# Altium footprint library VESC_MotorController.PcbLib: 146 footprints (part 7 of 10)
Each footprint in its own frame and in the unit in brackets; x right, y up, seen from the top. Pads: shape width x height; smd on the part's side, far side on the other; paste and mask are expansions set on the pad; w line width, h text height; cw(c..) or ccw(c..) is an arc to the next point about the centre after c.
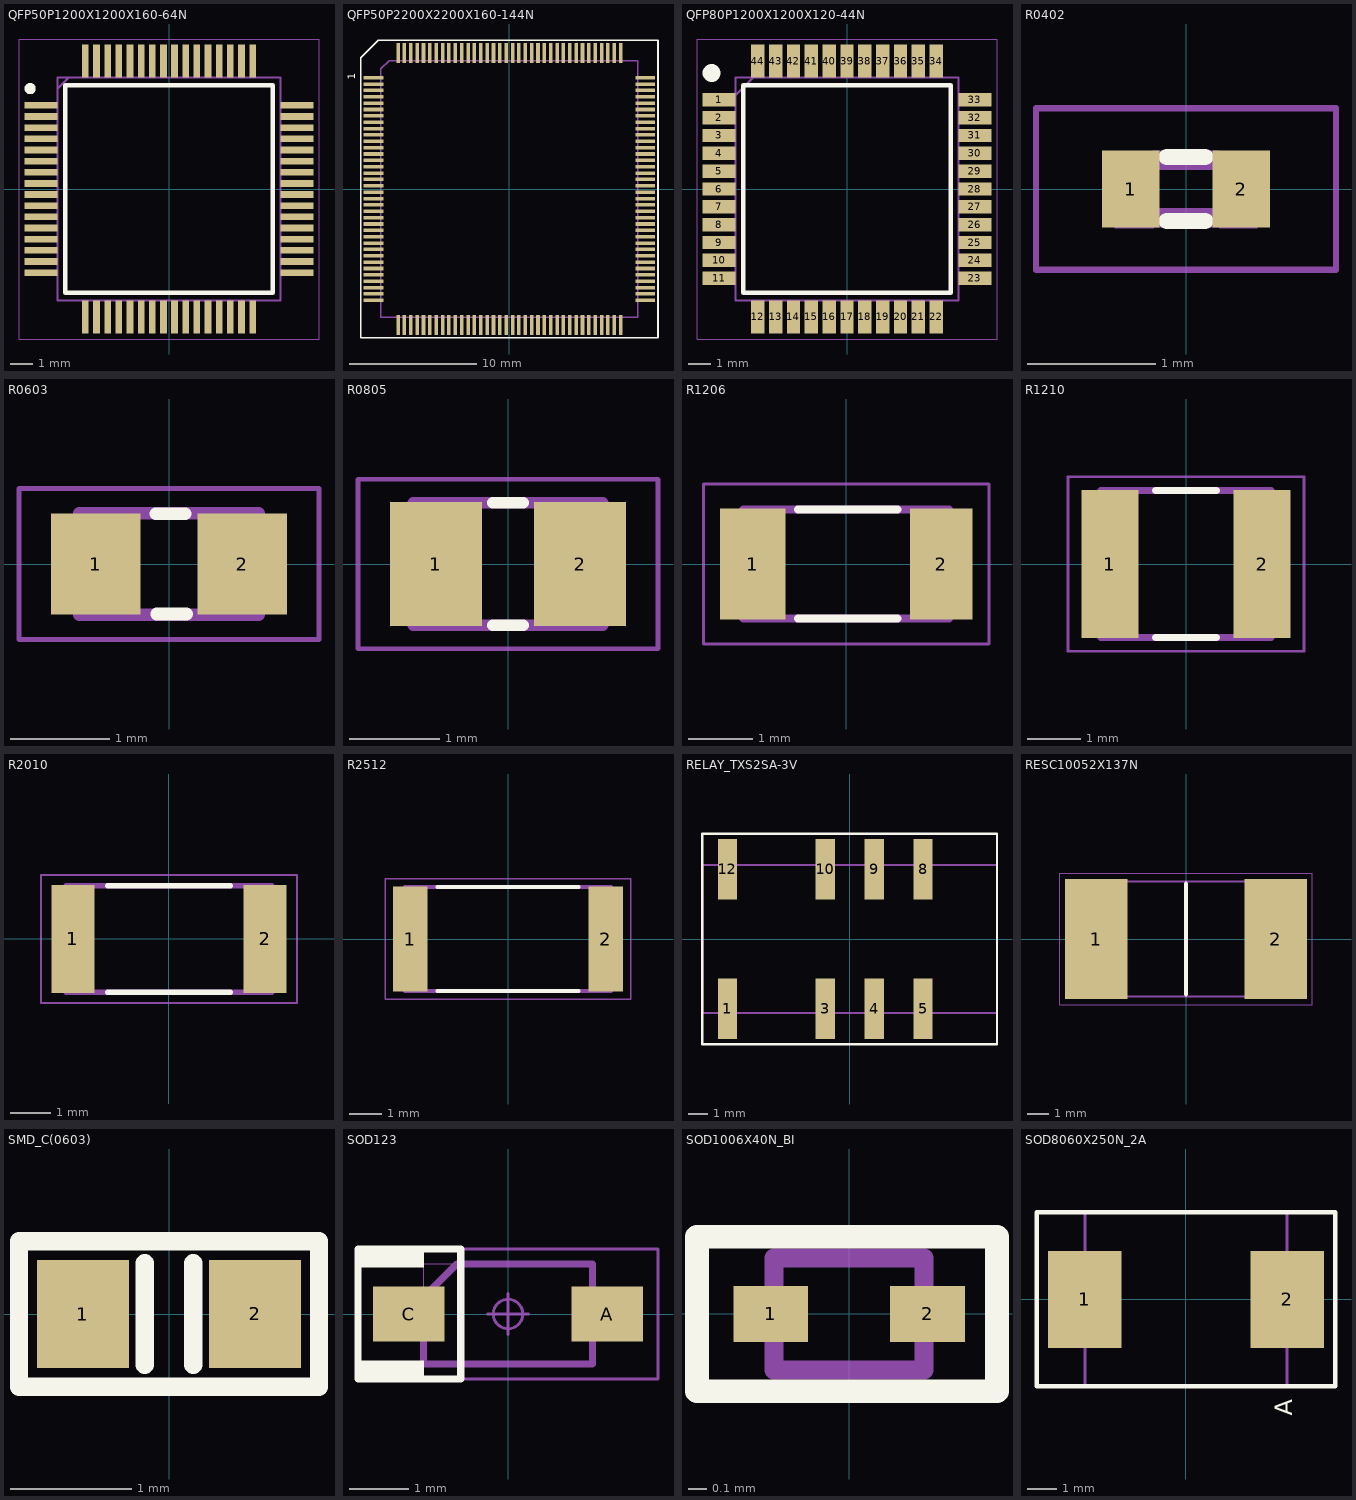
[diagram p6: the footprints below, top view; thin cyan lines are the x and y axes]

## QFP50P1200X1200X160-64N [mm]
pads (64):
  rect 1.475x0.3 smd: 1(-5.738,3.75) 2(-5.738,3.25) 3(-5.738,2.75) 4(-5.738,2.25) 5(-5.738,1.75) 6(-5.738,1.25) 7(-5.738,0.75) 8(-5.738,0.25) 9(-5.738,-0.25) 10(-5.738,-0.75) 11(-5.738,-1.25) 12(-5.738,-1.75) 13(-5.738,-2.25) 14(-5.738,-2.75) 15(-5.738,-3.25) 16(-5.738,-3.75) 33(5.738,-3.75) 34(5.738,-3.25) 35(5.738,-2.75) 36(5.738,-2.25) 37(5.738,-1.75) 38(5.738,-1.25) 39(5.738,-0.75) 40(5.738,-0.25) 41(5.738,0.25) 42(5.738,0.75) 43(5.738,1.25) 44(5.738,1.75) 45(5.738,2.25) 46(5.738,2.75) 47(5.738,3.25) 48(5.738,3.75)
  rect 0.3x1.475 smd: 17(-3.75,-5.738) 18(-3.25,-5.738) 19(-2.75,-5.738) 20(-2.25,-5.738) 21(-1.75,-5.738) 22(-1.25,-5.738) 23(-0.75,-5.738) 24(-0.25,-5.738) 25(0.25,-5.738) 26(0.75,-5.738) 27(1.25,-5.738) 28(1.75,-5.738) 29(2.25,-5.738) 30(2.75,-5.738) 31(3.25,-5.738) 32(3.75,-5.738) 49(3.75,5.738) 50(3.25,5.738) 51(2.75,5.738) 52(2.25,5.738) 53(1.75,5.738) 54(1.25,5.738) 55(0.75,5.738) 56(0.25,5.738) 57(-0.25,5.738) 58(-0.75,5.738) 59(-1.25,5.738) 60(-1.75,5.738) 61(-2.25,5.738) 62(-2.75,5.738) 63(-3.25,5.738) 64(-3.75,5.738)
Top Overlay:
  circle w0.25: c-6.225,4.5 r0.125
  lines w0.2: -4.65,-4.65 -4.65,4.65 4.65,4.65 4.65,-4.65 -4.65,-4.65
Mechanical 15:
  lines w0.1: -5,4.5 -4.5,5 ; -5,-5 -5,5 5,5 5,-5 -5,-5
Mechanical 20:
  lines w0.05: -6.725,-6.725 -6.725,6.725 6.725,6.725 6.725,-6.725 -6.725,-6.725
3D body "STM32F405RGT6TR.stp": height 1.6, standoff 0, extent -6,-6 6,6

## QFP50P2200X2200X160-144N [mm]
height 15
pads (144):
  rect 1.56x0.279 smd mask+0.051: 1(-10.68,8.75) 2(-10.68,8.25) 3(-10.68,7.75) 4(-10.68,7.25) 5(-10.68,6.75) 6(-10.68,6.25) 7(-10.68,5.75) 8(-10.68,5.25) 9(-10.68,4.75) 10(-10.68,4.25) 11(-10.68,3.75) 12(-10.68,3.25) 13(-10.68,2.75) 14(-10.68,2.25) 15(-10.68,1.75) 16(-10.68,1.25) 17(-10.68,0.75) 18(-10.68,0.25) 19(-10.68,-0.25) 20(-10.68,-0.75) 21(-10.68,-1.25) 22(-10.68,-1.75) 23(-10.68,-2.25) 24(-10.68,-2.75) 25(-10.68,-3.25) 26(-10.68,-3.75) 27(-10.68,-4.25) 28(-10.68,-4.75) 29(-10.68,-5.25) 30(-10.68,-5.75) 31(-10.68,-6.25) 32(-10.68,-6.75) 33(-10.68,-7.25) 34(-10.68,-7.75) 35(-10.68,-8.25) 36(-10.68,-8.75) 73(10.68,-8.75) 74(10.68,-8.25) 75(10.68,-7.75) 76(10.68,-7.25) 77(10.68,-6.75) 78(10.68,-6.25) 79(10.68,-5.75) 80(10.68,-5.25) 81(10.68,-4.75) 82(10.68,-4.25) 83(10.68,-3.75) 84(10.68,-3.25) 85(10.68,-2.75) 86(10.68,-2.25) 87(10.68,-1.75) 88(10.68,-1.25) 89(10.68,-0.75) 90(10.68,-0.25) 91(10.68,0.25) 92(10.68,0.75) 93(10.68,1.25) 94(10.68,1.75) 95(10.68,2.25) 96(10.68,2.75) 97(10.68,3.25) 98(10.68,3.75) 99(10.68,4.25) 100(10.68,4.75) 101(10.68,5.25) 102(10.68,5.75) 103(10.68,6.25) 104(10.68,6.75) 105(10.68,7.25) 106(10.68,7.75) 107(10.68,8.25) 108(10.68,8.75)
  rect 0.279x1.56 smd mask+0.051: 37(-8.75,-10.68) 38(-8.25,-10.68) 39(-7.75,-10.68) 40(-7.25,-10.68) 41(-6.75,-10.68) 42(-6.25,-10.68) 43(-5.75,-10.68) 44(-5.25,-10.68) 45(-4.75,-10.68) 46(-4.25,-10.68) 47(-3.75,-10.68) 48(-3.25,-10.68) 49(-2.75,-10.68) 50(-2.25,-10.68) 51(-1.75,-10.68) 52(-1.25,-10.68) 53(-0.75,-10.68) 54(-0.25,-10.68) 55(0.25,-10.68) 56(0.75,-10.68) 57(1.25,-10.68) 58(1.75,-10.68) 59(2.25,-10.68) 60(2.75,-10.68) 61(3.25,-10.68) 62(3.75,-10.68) 63(4.25,-10.68) 64(4.75,-10.68) 65(5.25,-10.68) 66(5.75,-10.68) 67(6.25,-10.68) 68(6.75,-10.68) 69(7.25,-10.68) 70(7.75,-10.68) 71(8.25,-10.68) 72(8.75,-10.68) 109(8.75,10.68) 110(8.25,10.68) 111(7.75,10.68) 112(7.25,10.68) 113(6.75,10.68) 114(6.25,10.68) 115(5.75,10.68) 116(5.25,10.68) 117(4.75,10.68) 118(4.25,10.68) 119(3.75,10.68) 120(3.25,10.68) 121(2.75,10.68) 122(2.25,10.68) 123(1.75,10.68) 124(1.25,10.68) 125(0.75,10.68) 126(0.25,10.68) 127(-0.25,10.68) 128(-0.75,10.68) 129(-1.25,10.68) 130(-1.75,10.68) 131(-2.25,10.68) 132(-2.75,10.68) 133(-3.25,10.68) 134(-3.75,10.68) 135(-4.25,10.68) 136(-4.75,10.68) 137(-5.25,10.68) 138(-5.75,10.68) 139(-6.25,10.68) 140(-6.75,10.68) 141(-7.25,10.68) 142(-7.75,10.68) 143(-8.25,10.68) 144(-8.75,10.68)
Top Overlay:
  lines w0.127: -11.684,-11.684 -11.684,10.316 -10.316,11.684 11.684,11.684 11.684,-11.684 -11.684,-11.684
  text "1" at -11.9,8.605 h1.02
Mechanical 13:
  lines w0.102: -10.1,-10.1 -10.1,9.458 -9.458,10.1 10.1,10.1 10.1,-10.1 -10.1,-10.1
  text "109" at 9.072,8.443 h1.02
  text "73" at 9.747,-9.361 h1.02
  text "37" at -8.402,-9.9 h1.02
  text "1" at -9.227,8.613 h1.02
  text ".Designator" at 0.688,-0.795 h1.02
3D body "STM32H753ZIT6.STEP": height 1.53, standoff -0.07, extent -11,-11 11,11

## QFP80P1200X1200X120-44N [mm]
pads (44):
  rect 1.475x0.6 smd: 1(-5.738,4) 2(-5.738,3.2) 3(-5.738,2.4) 4(-5.738,1.6) 5(-5.738,0.8) 6(-5.738,0) 7(-5.738,-0.8) 8(-5.738,-1.6) 9(-5.738,-2.4) 10(-5.738,-3.2) 11(-5.738,-4) 23(5.738,-4) 24(5.738,-3.2) 25(5.738,-2.4) 26(5.738,-1.6) 27(5.738,-0.8) 28(5.738,0) 29(5.738,0.8) 30(5.738,1.6) 31(5.738,2.4) 32(5.738,3.2) 33(5.738,4)
  rect 0.6x1.475 smd: 12(-4,-5.738) 13(-3.2,-5.738) 14(-2.4,-5.738) 15(-1.6,-5.738) 16(-0.8,-5.738) 17(0,-5.738) 18(0.8,-5.738) 19(1.6,-5.738) 20(2.4,-5.738) 21(3.2,-5.738) 22(4,-5.738) 34(4,5.738) 35(3.2,5.738) 36(2.4,5.738) 37(1.6,5.738) 38(0.8,5.738) 39(0,5.738) 40(-0.8,5.738) 41(-1.6,5.738) 42(-2.4,5.738) 43(-3.2,5.738) 44(-4,5.738)
Top Overlay:
  circle w0.4: c-6.075,5.2 r0.2
  lines w0.2: -4.65,-4.65 4.65,-4.65 4.65,4.65 -4.65,4.65 -4.65,-4.65
Mechanical 15:
  lines w0.1: -5,4.2 -4.2,5 ; -5,-5 5,-5 5,5 -5,5 -5,-5
Mechanical 20:
  lines w0.05: -6.725,-6.725 6.725,-6.725 6.725,6.725 -6.725,6.725 -6.725,-6.725
3D body "PIC16F74-I_PT.stp": height 1.2, standoff 0, extent -6,-6 6,6

## R0402 [mm]
pads (2):
  rect 0.45x0.6 smd: 1(-0.432,0) 2(0.432,0)
Top Overlay:
  lines w0.127: -0.15,-0.25 0.15,-0.25 ; -0.15,0.25 0.15,0.25
Mechanical 13:
  region: 0.559,-0.305 0.259,-0.305 0.259,0.295 0.559,0.295
  region: -0.254,-0.306 -0.555,-0.306 -0.555,0.295 -0.254,0.295
  lines w0.152: -0.245,-0.224 0.245,-0.224 ; -0.245,0.224 0.245,0.224
Mechanical 15:
  lines w0.051: -1.173,-0.633 -1.173,0.633 1.173,0.633 1.173,-0.633 -1.173,-0.633
3D body "RC0402FR-7D100RL.STP": height 0.41, standoff 0, extent -0.502,-0.246 0.498,0.254

## R0603 [mm] "RESISTOR SMD 0603"
height 0.45
pads (2):
  rect 0.9x1.02 smd: 1(-0.735,0) 2(0.735,0)
Top Overlay:
  lines w0.127: -0.135,0.506 0.165,0.506 ; -0.124,-0.502 0.176,-0.502
Mechanical 13:
  lines w0.127: -0.9,-0.51 0.9,-0.51 0.9,0.51 -0.9,0.51 -0.9,-0.51
Mechanical 15:
  lines w0.05: -1.508,-0.761 1.508,-0.761 1.508,0.761 -1.508,0.761 -1.508,-0.761
3D body "RC0603FR-072K2L.STP": height 0.56, standoff 0, extent -0.8,-0.4 0.8,0.4

## R0805 [mm]
pads (2):
  rect 1.02x1.38 smd: 1(-0.8,0) 2(0.8,0)
Top Overlay:
  lines w0.127: -0.17,-0.68 0.17,-0.68 ; -0.17,0.68 0.17,0.68
Mechanical 13:
  lines w0.127: -1.05,-0.68 1.05,-0.68 1.05,0.68 -1.05,0.68 -1.05,-0.68
Mechanical 15:
  lines w0.05: -1.665,-0.94 1.665,-0.94 1.665,0.94 -1.665,0.94 -1.665,-0.94
3D body "RC0805FR-0720RL.STP": height 0.61, standoff 0, extent -1,-0.625 1,0.625

## R1206 [mm]
height 1.1
pads (2):
  rect 1.02x1.73 smd: 1(-1.455,0)
  rect 0.97x1.73 smd: 2(1.48,0)
Top Overlay:
  lines w0.127: -0.75,-0.85 0.8,-0.85 ; -0.75,0.85 0.8,0.85
Mechanical 13:
  lines w0.127: -1.6,-0.85 1.6,-0.85 1.6,0.85 -1.6,0.85 -1.6,-0.85
Mechanical 15:
  lines w0.05: -2.22,-1.244 2.22,-1.244 2.22,1.244 -2.22,1.244 -2.22,-1.244
3D body "RC1206FR-0720RL.STP": height 0.66, standoff 0, extent -1.55,-0.8 1.55,0.8

## R1210 [mm]
pads (2):
  rect 1.07x2.77 smd: 1(-1.43,0) 2(1.43,0)
Top Overlay:
  lines w0.127: -0.57,-1.38 0.57,-1.38 ; -0.57,1.38 0.57,1.38
Mechanical 13:
  lines w0.127: -1.6,-1.38 -1.6,1.38 1.6,1.38 1.6,-1.38 -1.6,-1.38
Mechanical 15:
  lines w0.05: -2.215,-1.635 -2.215,1.635 2.215,1.635 2.215,-1.635 -2.215,-1.635
3D body "RC1210FR-0720RL.STP": height 0.66, standoff 0, extent -1.55,-1.3 1.55,1.3

## R2010 [mm]
pads (2):
  rect 1.07x2.67 smd: 1(-2.38,0) 2(2.38,0)
Top Overlay:
  lines w0.127: -1.52,-1.32 1.52,-1.32 ; -1.52,1.32 1.52,1.32
Mechanical 13:
  lines w0.127: -2.55,-1.32 2.55,-1.32 2.55,1.32 -2.55,1.32 -2.55,-1.32
Mechanical 15:
  lines w0.05: -3.165,-1.585 3.165,-1.585 3.165,1.585 -3.165,1.585 -3.165,-1.585
3D body "RC2010FK-0739KL.STP": height 0.66, standoff 0, extent -2.5,-1.25 2.5,1.25

## R2512 [mm]
pads (2):
  rect 1.07x3.27 smd: 1(-3.055,0) 2(3.055,0)
Top Overlay:
  lines w0.127: -2.2,-1.63 2.2,-1.63 ; -2.2,1.63 2.2,1.63
Mechanical 13:
  lines w0.127: -3.22,-1.63 3.22,-1.63 3.22,1.63 -3.22,1.63 -3.22,-1.63
Mechanical 15:
  lines w0.05: -3.84,-1.885 3.84,-1.885 3.84,1.885 -3.84,1.885 -3.84,-1.885
3D body "RC2512FK-0720RL.STP": height 0.66, standoff 0, extent -3.175,-1.55 3.175,1.55

## RELAY_TXS2SA-3V [mm]
pads (8):
  rect 1x3.16 smd paste+0 mask+0.051: 1(-6.35,-3.62) 3(-1.27,-3.62) 4(1.27,-3.62) 5(3.81,-3.62) 8(3.81,3.62) 9(1.27,3.62) 10(-1.27,3.62) 12(-6.35,3.62)
Top Overlay:
  lines w0.127: -7.65,-5.461 -7.65,5.461 7.65,5.461 7.65,-5.461 -7.65,-5.461
Mechanical 13:
  lines w0.102: -7.65,-3.85 -7.65,3.85 7.65,3.85 7.65,-3.85 -7.65,-3.85
  text ".Designator" at 1.088,0.215 h1.02
3D body "Relay_Panasonic_TXS2SA-3V_eec.STEP": height 8.7, standoff 0, extent -7.5,-4.7 7.5,4.7

## RESC10052X137N [mm]
pads (2):
  rect 2.85x5.5 smd: 1(-4.1,0) 2(4.1,0)
Top Overlay:
  lines w0.2: 0,-2.525 0,2.525
Mechanical 15:
  lines w0.1: -5,-2.625 5,-2.625 5,2.625 -5,2.625 -5,-2.625
Mechanical 20:
  lines w0.05: -5.775,-3 5.775,-3 5.775,3 -5.775,3 -5.775,-3
3D body "CSS2H-3920R-L500FE.stp": height 1.37, standoff 0, extent -5,-2.625 5,2.625

## SMD_C(0603) [mil]
pads (2):
  rect 30x35 smd mask+2: 1(-28,0) 2(28,0)
Top Overlay:
  lines w6: -7.87,-16.54 -7.87,16.54 ; 7.87,-16.54 7.87,16.54 ; -48.82,-23.62 -48.82,23.62 48.82,23.62 48.82,-23.62 -48.82,-23.62
3D body "User Library-CapCeramic_Kemet_0603_1608.step": height 31.5, standoff 0, extent -31.49,-15.74 31.5,15.75

## SOD123 [mm]
height 1.35
pads (2):
  rect 1.21x0.93 smd: A(1.68,0) C(-1.68,0)
Top Overlay:
  rectangle: -2.54,-1.1 -1.425,-0.787
  rectangle: -2.54,0.787 -1.425,1.1
  lines w0.12: -2.54,-1.1 -2.54,1.1 -0.8,1.1 -0.8,-1.1 -2.54,-1.1
Mechanical 13:
  lines w0.001: -1.425,-0.85 -1.425,0.85 1.425,0.85 1.425,-0.85 -1.425,-0.85
  lines w0.12: -1.43,-0.85 -1.43,0.283 -0.863,0.85 1.43,0.85 1.43,-0.85 -1.43,-0.85
Mechanical 15:
  circle w0.05: c0,0 r0.25
  lines w0.05: -0.35,0 0.35,0 ; 0,-0.35 0,0.35 ; -2.54,-1.1 2.54,-1.1 2.54,1.1 -2.54,1.1 -2.54,-1.1
3D body "B140HW-7.STEP": height 1.44, standoff -0.01, extent -1.825,-0.775 1.825,0.775

## SOD1006X40N_BI [mm] "ESD9B3.3ST5G,ESD9B3.3ST5G"
height 0.4
pads (2):
  rect 0.4x0.3 smd mask+0.051: 1(-0.42,0) 2(0.42,0)
Top Overlay:
  lines w0.127: -0.816,-0.415 -0.816,0.414 0.793,0.414 0.793,-0.415 -0.816,-0.415
Mechanical 13:
  lines w0.102: -0.404,-0.3 -0.404,0.3 0.4,0.3 0.4,-0.3 -0.404,-0.3
  text ".Designator" at 0.684,-0.866 h1.02
3D body "User Library-DIODE_SOD-923.step": height 0.43, standoff 0, extent -0.525,-0.325 0.525,0.325

## SOD8060X250N_2A [mm] "B550C-13-F,DIODE SCHOTTKY 50V 5A SMC"
height 2.5
pads (2):
  rect 2.5x3.3 smd mask+0.051: 1(-3.45,0) 2(3.45,0)
Top Overlay:
  lines w0.152: -3.427,2.953 5.08,2.953 5.08,-2.953 -5.08,-2.953 -5.08,2.953 -3.162,2.953
  text "A" at 3.813,-3.952 h1.02
Mechanical 13:
  lines w0.102: -3.162,2.953 -3.427,2.953 ; -3.427,2.953 -3.427,-2.953 3.427,-2.953 3.427,2.953 -3.427,2.953
  text ".Designator" at -0.241,-0.464 h1.02
  text "A" at 3.023,-0.307 h1.02
3D body "User Library-DO-214AB SMC.step": height 2.3, standoff 0, extent -3.975,-2.95 3.975,2.95